# Altium schematic symbol library Блоки трансформаторов импульсных.SCHLIB: 325 symbols (part 2 of 2)
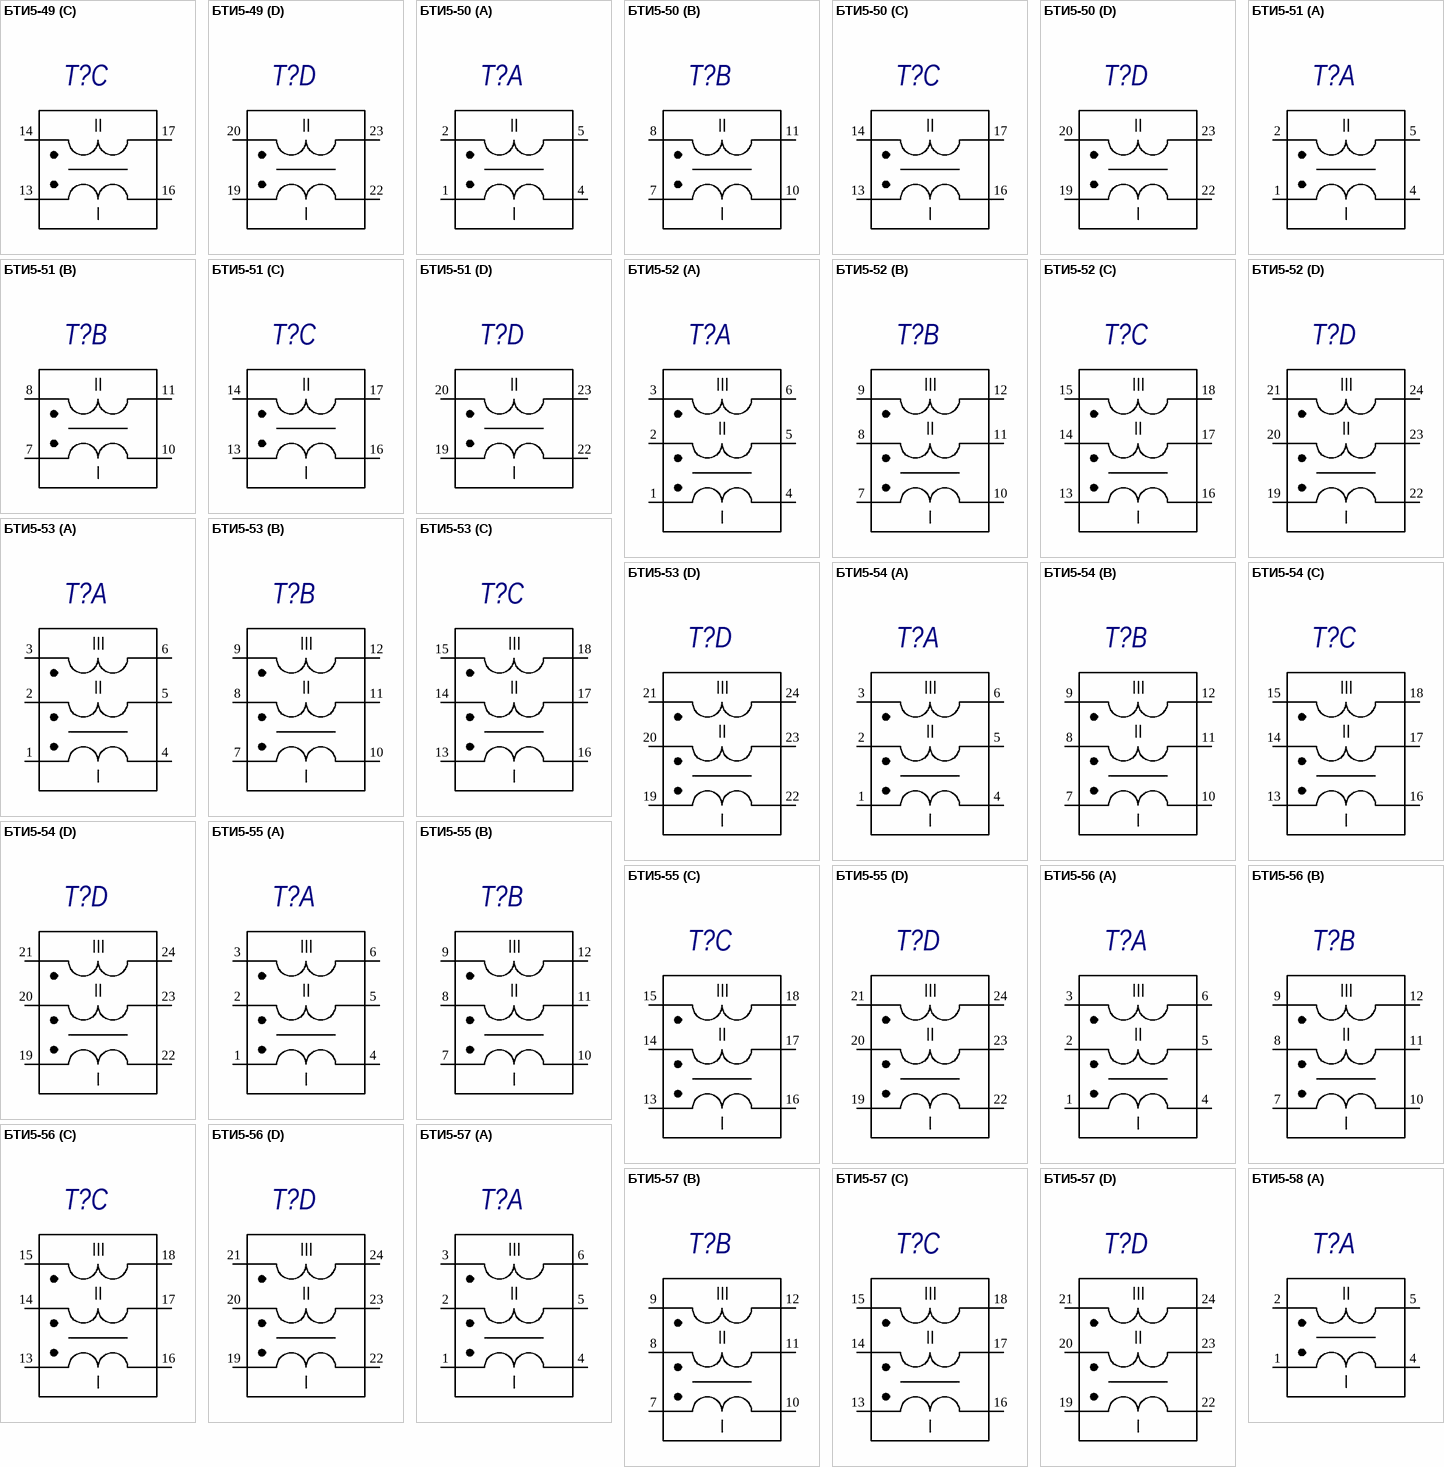
[diagram p28: symbols БТИ5-49 to БТИ5-58]

## БТИ5-57
designator T?
БТИ5; Manufacturer: ПАО  «МСТАТОР»; ManufacturerCountry: Россия; Value: {Value}; Наименование элемента: Дроссель; Category: Трансформатор; ComponentLink1Description: Manufacturer Link
footprint БТИ5
part A pins: 1, 2, 3, 4, 5, 6
part B pins: 7, 8, 9, 10, 11, 12
part C pins: 13, 14, 15, 16, 17, 18
part D pins: 19, 20, 21, 22, 23, 24
part A text: III; II; I
part B text: III; II; I
part C text: III; II; I
part D text: III; II; I

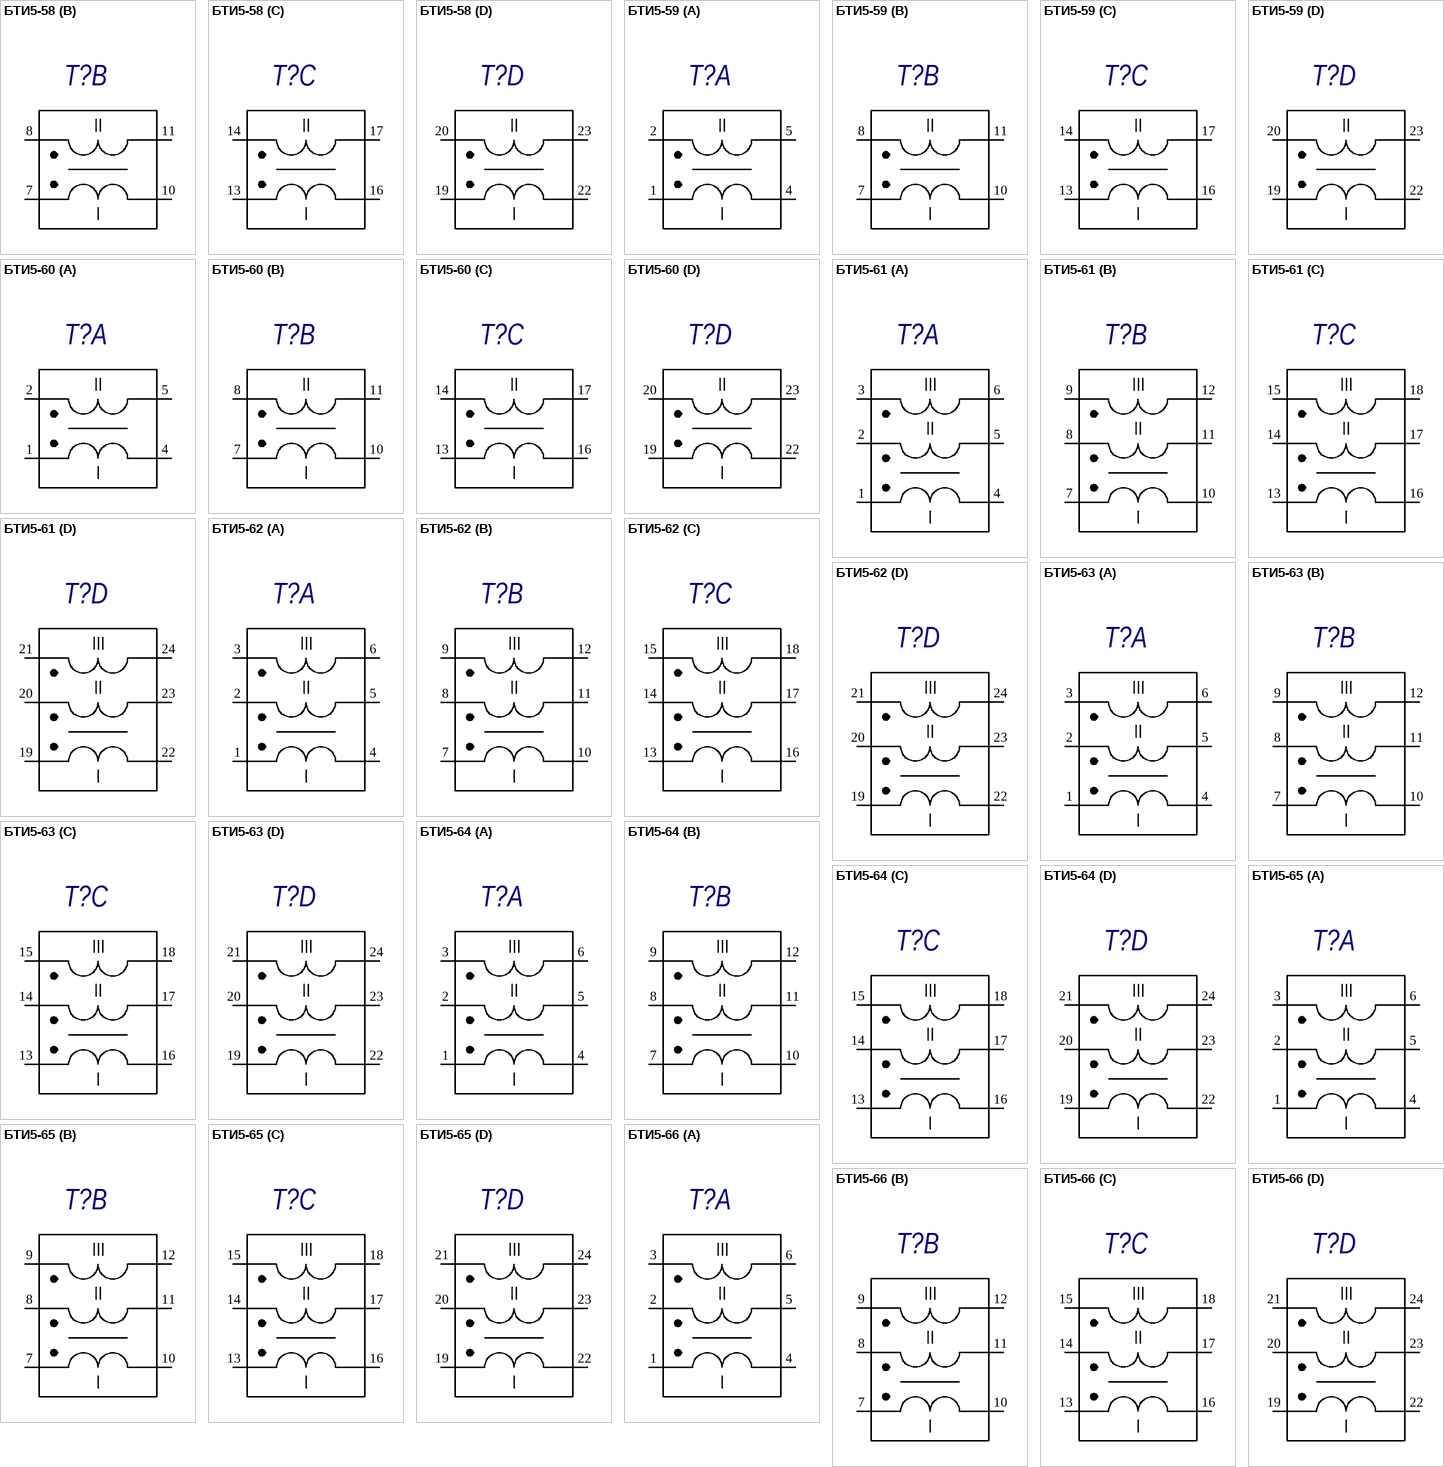
[diagram p18: symbols БТИ5-58 to БТИ5-66]

## БТИ5-58
designator T?
БТИ5; Manufacturer: ПАО  «МСТАТОР»; ManufacturerCountry: Россия; Value: {Value}; Наименование элемента: Дроссель; Category: Трансформатор; ComponentLink1Description: Manufacturer Link
footprint БТИ5
part A pins: 1, 2, 4, 5
part B pins: 7, 8, 10, 11
part C pins: 13, 14, 16, 17
part D pins: 19, 20, 22, 23
part A text: II; I
part B text: II; I
part C text: II; I
part D text: II; I

## БТИ5-59
designator T?
БТИ5; Manufacturer: ПАО  «МСТАТОР»; ManufacturerCountry: Россия; Value: {Value}; Наименование элемента: Дроссель; Category: Трансформатор; ComponentLink1Description: Manufacturer Link
footprint БТИ5
part A pins: 1, 2, 4, 5
part B pins: 7, 8, 10, 11
part C pins: 13, 14, 16, 17
part D pins: 19, 20, 22, 23
part A text: II; I
part B text: II; I
part C text: II; I
part D text: II; I

## БТИ5-60
designator T?
БТИ5; Manufacturer: ПАО  «МСТАТОР»; ManufacturerCountry: Россия; Value: {Value}; Наименование элемента: Дроссель; Category: Трансформатор; ComponentLink1Description: Manufacturer Link
footprint БТИ5
part A pins: 1, 2, 4, 5
part B pins: 7, 8, 10, 11
part C pins: 13, 14, 16, 17
part D pins: 19, 20, 22, 23
part A text: II; I
part B text: II; I
part C text: II; I
part D text: II; I

## БТИ5-61
designator T?
БТИ5; Manufacturer: ПАО  «МСТАТОР»; ManufacturerCountry: Россия; Value: {Value}; Наименование элемента: Дроссель; Category: Трансформатор; ComponentLink1Description: Manufacturer Link
footprint БТИ5
part A pins: 1, 2, 3, 4, 5, 6
part B pins: 7, 8, 9, 10, 11, 12
part C pins: 13, 14, 15, 16, 17, 18
part D pins: 19, 20, 21, 22, 23, 24
part A text: III; II; I
part B text: III; II; I
part C text: III; II; I
part D text: III; II; I

## БТИ5-62
designator T?
БТИ5; Manufacturer: ПАО  «МСТАТОР»; ManufacturerCountry: Россия; Value: {Value}; Наименование элемента: Дроссель; Category: Трансформатор; ComponentLink1Description: Manufacturer Link
footprint БТИ5
part A pins: 1, 2, 3, 4, 5, 6
part B pins: 7, 8, 9, 10, 11, 12
part C pins: 13, 14, 15, 16, 17, 18
part D pins: 19, 20, 21, 22, 23, 24
part A text: III; II; I
part B text: III; II; I
part C text: III; II; I
part D text: III; II; I

## БТИ5-63
designator T?
БТИ5; Manufacturer: ПАО  «МСТАТОР»; ManufacturerCountry: Россия; Value: {Value}; Наименование элемента: Дроссель; Category: Трансформатор; ComponentLink1Description: Manufacturer Link
footprint БТИ5
part A pins: 1, 2, 3, 4, 5, 6
part B pins: 7, 8, 9, 10, 11, 12
part C pins: 13, 14, 15, 16, 17, 18
part D pins: 19, 20, 21, 22, 23, 24
part A text: III; II; I
part B text: III; II; I
part C text: III; II; I
part D text: III; II; I

## БТИ5-64
designator T?
БТИ5; Manufacturer: ПАО  «МСТАТОР»; ManufacturerCountry: Россия; Value: {Value}; Наименование элемента: Дроссель; Category: Трансформатор; ComponentLink1Description: Manufacturer Link
footprint БТИ5
part A pins: 1, 2, 3, 4, 5, 6
part B pins: 7, 8, 9, 10, 11, 12
part C pins: 13, 14, 15, 16, 17, 18
part D pins: 19, 20, 21, 22, 23, 24
part A text: III; II; I
part B text: III; II; I
part C text: III; II; I
part D text: III; II; I

## БТИ5-65
designator T?
БТИ5; Manufacturer: ПАО  «МСТАТОР»; ManufacturerCountry: Россия; Value: {Value}; Наименование элемента: Дроссель; Category: Трансформатор; ComponentLink1Description: Manufacturer Link
footprint БТИ5
part A pins: 1, 2, 3, 4, 5, 6
part B pins: 7, 8, 9, 10, 11, 12
part C pins: 13, 14, 15, 16, 17, 18
part D pins: 19, 20, 21, 22, 23, 24
part A text: III; II; I
part B text: III; II; I
part C text: III; II; I
part D text: III; II; I

## БТИ5-66
designator T?
БТИ5; Manufacturer: ПАО  «МСТАТОР»; ManufacturerCountry: Россия; Value: {Value}; Наименование элемента: Дроссель; Category: Трансформатор; ComponentLink1Description: Manufacturer Link
footprint БТИ5
part A pins: 1, 2, 3, 4, 5, 6
part B pins: 7, 8, 9, 10, 11, 12
part C pins: 13, 14, 15, 16, 17, 18
part D pins: 19, 20, 21, 22, 23, 24
part A text: III; II; I
part B text: III; II; I
part C text: III; II; I
part D text: III; II; I

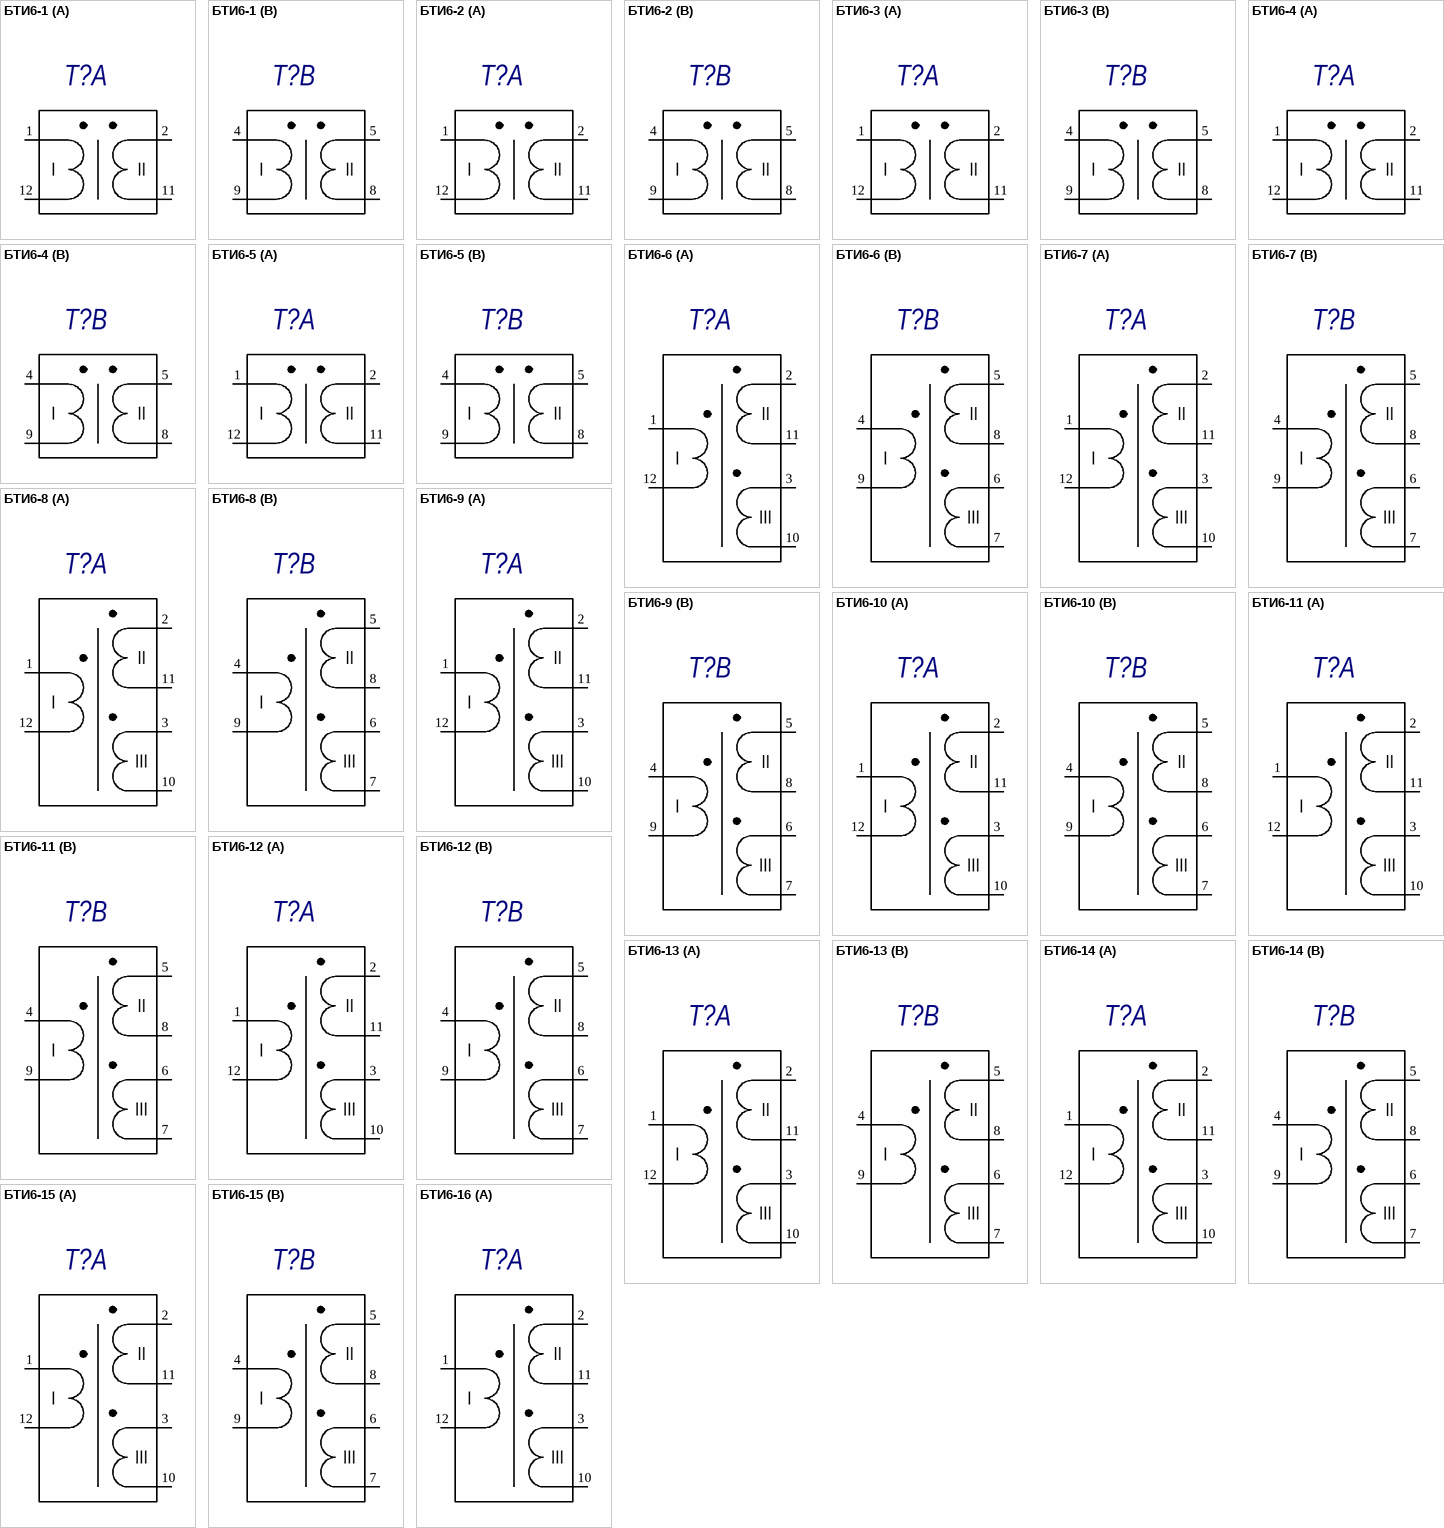
[diagram p19: symbols БТИ6-1 to БТИ6-16]

## БТИ6-1
designator T?
БТИ6; Manufacturer: ПАО  «МСТАТОР»; ManufacturerCountry: Россия; Value: {Value}; Наименование элемента: Дроссель; Category: Трансформатор; ComponentLink1Description: Manufacturer Link
footprint БТИ6
part A pins: 1, 2, 11, 12
part B pins: 4, 5, 8, 9
part A text: I; II
part B text: I; II

## БТИ6-2
designator T?
БТИ6; Manufacturer: ПАО  «МСТАТОР»; ManufacturerCountry: Россия; Value: {Value}; Наименование элемента: Дроссель; Category: Трансформатор; ComponentLink1Description: Manufacturer Link
footprint БТИ6
part A pins: 1, 2, 11, 12
part B pins: 4, 5, 8, 9
part A text: I; II
part B text: I; II

## БТИ6-3
designator T?
БТИ6; Manufacturer: ПАО  «МСТАТОР»; ManufacturerCountry: Россия; Value: {Value}; Наименование элемента: Дроссель; Category: Трансформатор; ComponentLink1Description: Manufacturer Link
footprint БТИ6
part A pins: 1, 2, 11, 12
part B pins: 4, 5, 8, 9
part A text: I; II
part B text: I; II

## БТИ6-4
designator T?
БТИ6; Manufacturer: ПАО  «МСТАТОР»; ManufacturerCountry: Россия; Value: {Value}; Наименование элемента: Дроссель; Category: Трансформатор; ComponentLink1Description: Manufacturer Link
footprint БТИ6
part A pins: 1, 2, 11, 12
part B pins: 4, 5, 8, 9
part A text: I; II
part B text: I; II

## БТИ6-5
designator T?
БТИ6; Manufacturer: ПАО  «МСТАТОР»; ManufacturerCountry: Россия; Value: {Value}; Наименование элемента: Дроссель; Category: Трансформатор; ComponentLink1Description: Manufacturer Link
footprint БТИ6
part A pins: 1, 2, 11, 12
part B pins: 4, 5, 8, 9
part A text: I; II
part B text: I; II

## БТИ6-6
designator T?
БТИ6; Manufacturer: ПАО  «МСТАТОР»; ManufacturerCountry: Россия; Value: {Value}; Наименование элемента: Дроссель; Category: Трансформатор; ComponentLink1Description: Manufacturer Link
footprint БТИ6
part A pins: 1, 2, 3, 10, 11, 12
part B pins: 4, 5, 6, 7, 8, 9
part A text: II; I; III
part B text: II; I; III

## БТИ6-7
designator T?
БТИ6; Manufacturer: ПАО  «МСТАТОР»; ManufacturerCountry: Россия; Value: {Value}; Наименование элемента: Дроссель; Category: Трансформатор; ComponentLink1Description: Manufacturer Link
footprint БТИ6
part A pins: 1, 2, 3, 10, 11, 12
part B pins: 4, 5, 6, 7, 8, 9
part A text: II; I; III
part B text: II; I; III

## БТИ6-8
designator T?
БТИ6; Manufacturer: ПАО  «МСТАТОР»; ManufacturerCountry: Россия; Value: {Value}; Наименование элемента: Дроссель; Category: Трансформатор; ComponentLink1Description: Manufacturer Link
footprint БТИ6
part A pins: 1, 2, 3, 10, 11, 12
part B pins: 4, 5, 6, 7, 8, 9
part A text: II; I; III
part B text: II; I; III

## БТИ6-9
designator T?
БТИ6; Manufacturer: ПАО  «МСТАТОР»; ManufacturerCountry: Россия; Value: {Value}; Наименование элемента: Дроссель; Category: Трансформатор; ComponentLink1Description: Manufacturer Link
footprint БТИ6
part A pins: 1, 2, 3, 10, 11, 12
part B pins: 4, 5, 6, 7, 8, 9
part A text: II; I; III
part B text: II; I; III

## БТИ6-10
designator T?
БТИ6; Manufacturer: ПАО  «МСТАТОР»; ManufacturerCountry: Россия; Value: {Value}; Наименование элемента: Дроссель; Category: Трансформатор; ComponentLink1Description: Manufacturer Link
footprint БТИ6
part A pins: 1, 2, 3, 10, 11, 12
part B pins: 4, 5, 6, 7, 8, 9
part A text: II; I; III
part B text: II; I; III

## БТИ6-11
designator T?
БТИ6; Manufacturer: ПАО  «МСТАТОР»; ManufacturerCountry: Россия; Value: {Value}; Наименование элемента: Дроссель; Category: Трансформатор; ComponentLink1Description: Manufacturer Link
footprint БТИ6
part A pins: 1, 2, 3, 10, 11, 12
part B pins: 4, 5, 6, 7, 8, 9
part A text: II; I; III
part B text: II; I; III

## БТИ6-12
designator T?
БТИ6; Manufacturer: ПАО  «МСТАТОР»; ManufacturerCountry: Россия; Value: {Value}; Наименование элемента: Дроссель; Category: Трансформатор; ComponentLink1Description: Manufacturer Link
footprint БТИ6
part A pins: 1, 2, 3, 10, 11, 12
part B pins: 4, 5, 6, 7, 8, 9
part A text: II; I; III
part B text: II; I; III

## БТИ6-13
designator T?
БТИ6; Manufacturer: ПАО  «МСТАТОР»; ManufacturerCountry: Россия; Value: {Value}; Наименование элемента: Дроссель; Category: Трансформатор; ComponentLink1Description: Manufacturer Link
footprint БТИ6
part A pins: 1, 2, 3, 10, 11, 12
part B pins: 4, 5, 6, 7, 8, 9
part A text: II; I; III
part B text: II; I; III

## БТИ6-14
designator T?
БТИ6; Manufacturer: ПАО  «МСТАТОР»; ManufacturerCountry: Россия; Value: {Value}; Наименование элемента: Дроссель; Category: Трансформатор; ComponentLink1Description: Manufacturer Link
footprint БТИ6
part A pins: 1, 2, 3, 10, 11, 12
part B pins: 4, 5, 6, 7, 8, 9
part A text: II; I; III
part B text: II; I; III

## БТИ6-15
designator T?
БТИ6; Manufacturer: ПАО  «МСТАТОР»; ManufacturerCountry: Россия; Value: {Value}; Наименование элемента: Дроссель; Category: Трансформатор; ComponentLink1Description: Manufacturer Link
footprint БТИ6
part A pins: 1, 2, 3, 10, 11, 12
part B pins: 4, 5, 6, 7, 8, 9
part A text: II; I; III
part B text: II; I; III

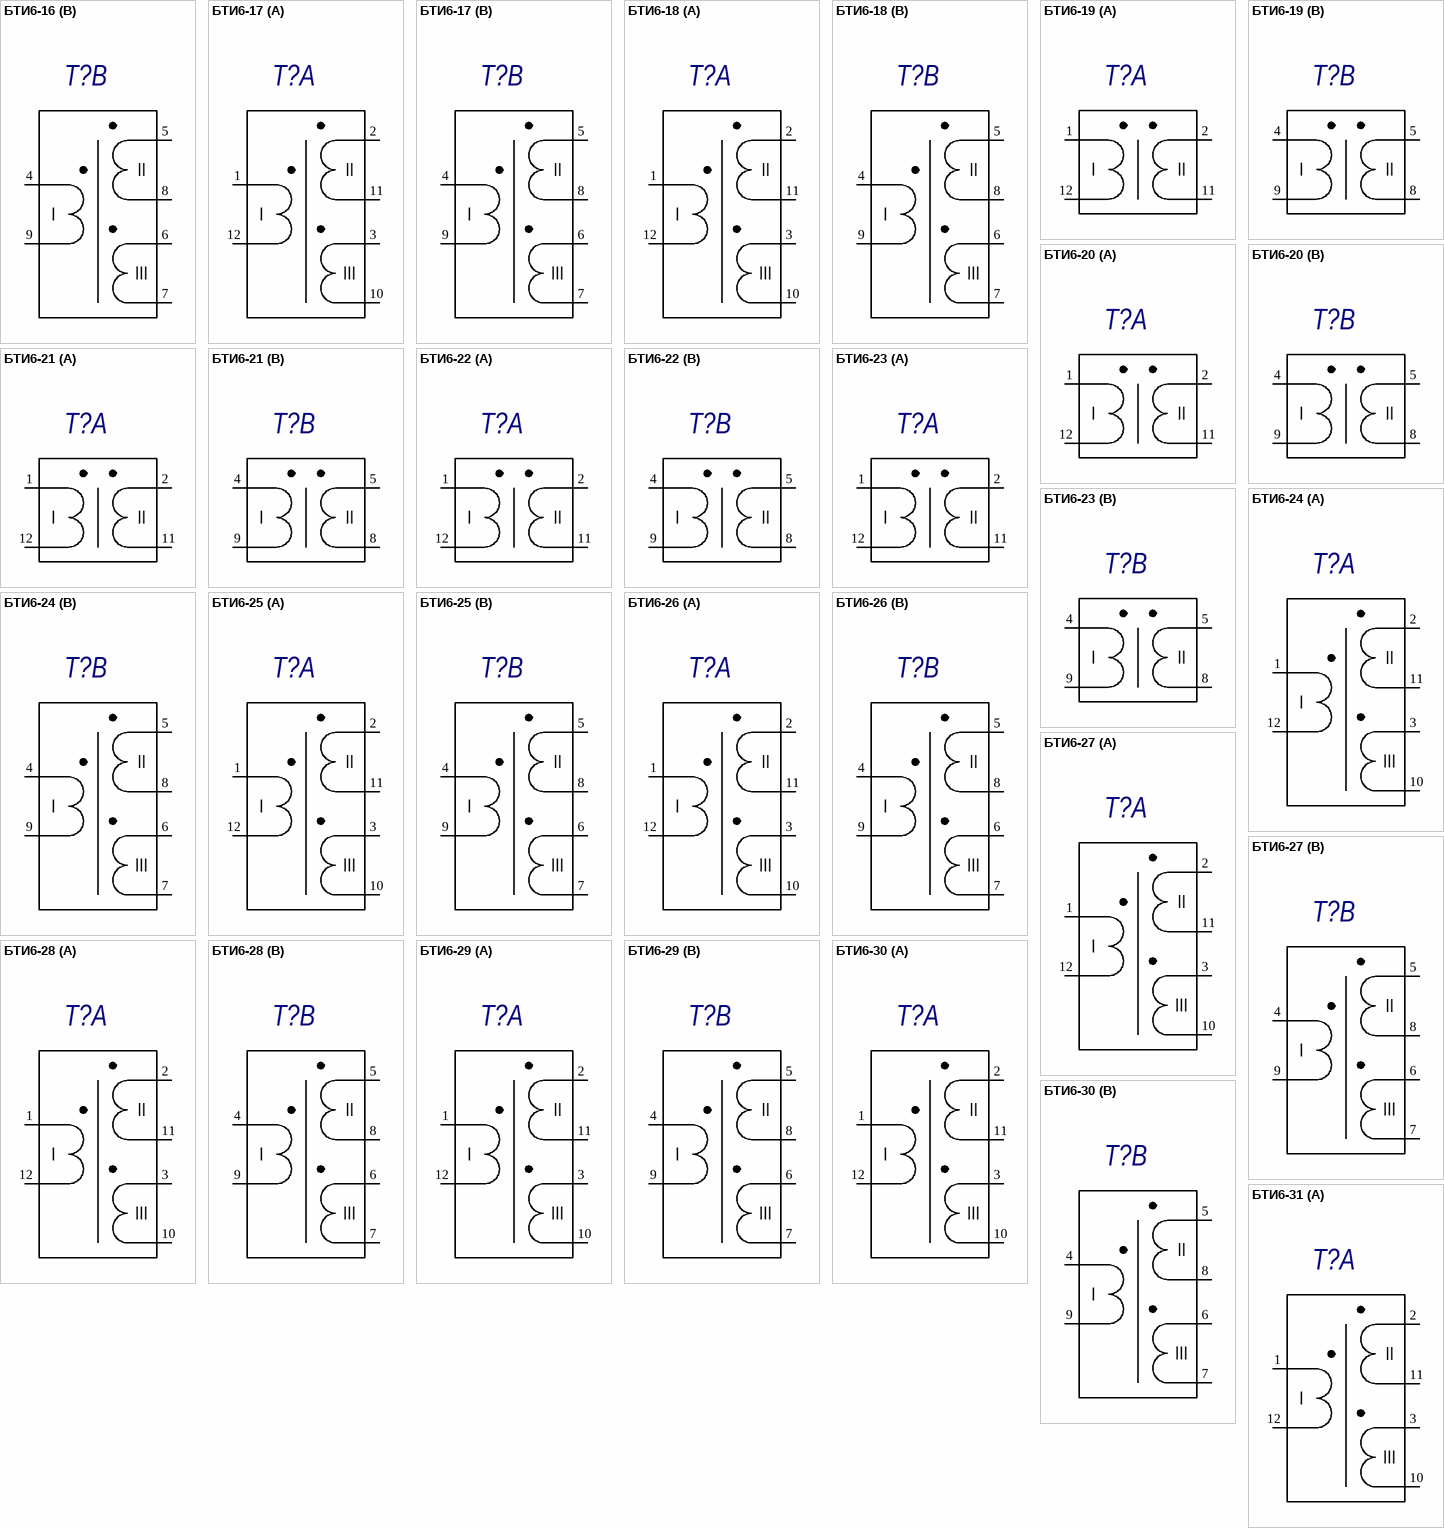
[diagram p20: symbols БТИ6-16 to БТИ6-31]

## БТИ6-16
designator T?
БТИ6; Manufacturer: ПАО  «МСТАТОР»; ManufacturerCountry: Россия; Value: {Value}; Наименование элемента: Дроссель; Category: Трансформатор; ComponentLink1Description: Manufacturer Link
footprint БТИ6
part A pins: 1, 2, 3, 10, 11, 12
part B pins: 4, 5, 6, 7, 8, 9
part A text: II; I; III
part B text: II; I; III

## БТИ6-17
designator T?
БТИ6; Manufacturer: ПАО  «МСТАТОР»; ManufacturerCountry: Россия; Value: {Value}; Наименование элемента: Дроссель; Category: Трансформатор; ComponentLink1Description: Manufacturer Link
footprint БТИ6
part A pins: 1, 2, 3, 10, 11, 12
part B pins: 4, 5, 6, 7, 8, 9
part A text: II; I; III
part B text: II; I; III

## БТИ6-18
designator T?
БТИ6; Manufacturer: ПАО  «МСТАТОР»; ManufacturerCountry: Россия; Value: {Value}; Наименование элемента: Дроссель; Category: Трансформатор; ComponentLink1Description: Manufacturer Link
footprint БТИ6
part A pins: 1, 2, 3, 10, 11, 12
part B pins: 4, 5, 6, 7, 8, 9
part A text: II; I; III
part B text: II; I; III

## БТИ6-19
designator T?
БТИ6; Manufacturer: ПАО  «МСТАТОР»; ManufacturerCountry: Россия; Value: {Value}; Наименование элемента: Дроссель; Category: Трансформатор; ComponentLink1Description: Manufacturer Link
footprint БТИ6
part A pins: 1, 2, 11, 12
part B pins: 4, 5, 8, 9
part A text: I; II
part B text: I; II

## БТИ6-20
designator T?
БТИ6; Manufacturer: ПАО  «МСТАТОР»; ManufacturerCountry: Россия; Value: {Value}; Наименование элемента: Дроссель; Category: Трансформатор; ComponentLink1Description: Manufacturer Link
footprint БТИ6
part A pins: 1, 2, 11, 12
part B pins: 4, 5, 8, 9
part A text: I; II
part B text: I; II

## БТИ6-21
designator T?
БТИ6; Manufacturer: ПАО  «МСТАТОР»; ManufacturerCountry: Россия; Value: {Value}; Наименование элемента: Дроссель; Category: Трансформатор; ComponentLink1Description: Manufacturer Link
footprint БТИ6
part A pins: 1, 2, 11, 12
part B pins: 4, 5, 8, 9
part A text: I; II
part B text: I; II

## БТИ6-22
designator T?
БТИ6; Manufacturer: ПАО  «МСТАТОР»; ManufacturerCountry: Россия; Value: {Value}; Наименование элемента: Дроссель; Category: Трансформатор; ComponentLink1Description: Manufacturer Link
footprint БТИ6
part A pins: 1, 2, 11, 12
part B pins: 4, 5, 8, 9
part A text: I; II
part B text: I; II

## БТИ6-23
designator T?
БТИ6; Manufacturer: ПАО  «МСТАТОР»; ManufacturerCountry: Россия; Value: {Value}; Наименование элемента: Дроссель; Category: Трансформатор; ComponentLink1Description: Manufacturer Link
footprint БТИ6
part A pins: 1, 2, 11, 12
part B pins: 4, 5, 8, 9
part A text: I; II
part B text: I; II

## БТИ6-24
designator T?
БТИ6; Manufacturer: ПАО  «МСТАТОР»; ManufacturerCountry: Россия; Value: {Value}; Наименование элемента: Дроссель; Category: Трансформатор; ComponentLink1Description: Manufacturer Link
footprint БТИ6
part A pins: 1, 2, 3, 10, 11, 12
part B pins: 4, 5, 6, 7, 8, 9
part A text: II; I; III
part B text: II; I; III

## БТИ6-25
designator T?
БТИ6; Manufacturer: ПАО  «МСТАТОР»; ManufacturerCountry: Россия; Value: {Value}; Наименование элемента: Дроссель; Category: Трансформатор; ComponentLink1Description: Manufacturer Link
footprint БТИ6
part A pins: 1, 2, 3, 10, 11, 12
part B pins: 4, 5, 6, 7, 8, 9
part A text: II; I; III
part B text: II; I; III

## БТИ6-26
designator T?
БТИ6; Manufacturer: ПАО  «МСТАТОР»; ManufacturerCountry: Россия; Value: {Value}; Наименование элемента: Дроссель; Category: Трансформатор; ComponentLink1Description: Manufacturer Link
footprint БТИ6
part A pins: 1, 2, 3, 10, 11, 12
part B pins: 4, 5, 6, 7, 8, 9
part A text: II; I; III
part B text: II; I; III

## БТИ6-27
designator T?
БТИ6; Manufacturer: ПАО  «МСТАТОР»; ManufacturerCountry: Россия; Value: {Value}; Наименование элемента: Дроссель; Category: Трансформатор; ComponentLink1Description: Manufacturer Link
footprint БТИ6
part A pins: 1, 2, 3, 10, 11, 12
part B pins: 4, 5, 6, 7, 8, 9
part A text: II; I; III
part B text: II; I; III

## БТИ6-28
designator T?
БТИ6; Manufacturer: ПАО  «МСТАТОР»; ManufacturerCountry: Россия; Value: {Value}; Наименование элемента: Дроссель; Category: Трансформатор; ComponentLink1Description: Manufacturer Link
footprint БТИ6
part A pins: 1, 2, 3, 10, 11, 12
part B pins: 4, 5, 6, 7, 8, 9
part A text: II; I; III
part B text: II; I; III

## БТИ6-29
designator T?
БТИ6; Manufacturer: ПАО  «МСТАТОР»; ManufacturerCountry: Россия; Value: {Value}; Наименование элемента: Дроссель; Category: Трансформатор; ComponentLink1Description: Manufacturer Link
footprint БТИ6
part A pins: 1, 2, 3, 10, 11, 12
part B pins: 4, 5, 6, 7, 8, 9
part A text: II; I; III
part B text: II; I; III

## БТИ6-30
designator T?
БТИ6; Manufacturer: ПАО  «МСТАТОР»; ManufacturerCountry: Россия; Value: {Value}; Наименование элемента: Дроссель; Category: Трансформатор; ComponentLink1Description: Manufacturer Link
footprint БТИ6
part A pins: 1, 2, 3, 10, 11, 12
part B pins: 4, 5, 6, 7, 8, 9
part A text: II; I; III
part B text: II; I; III

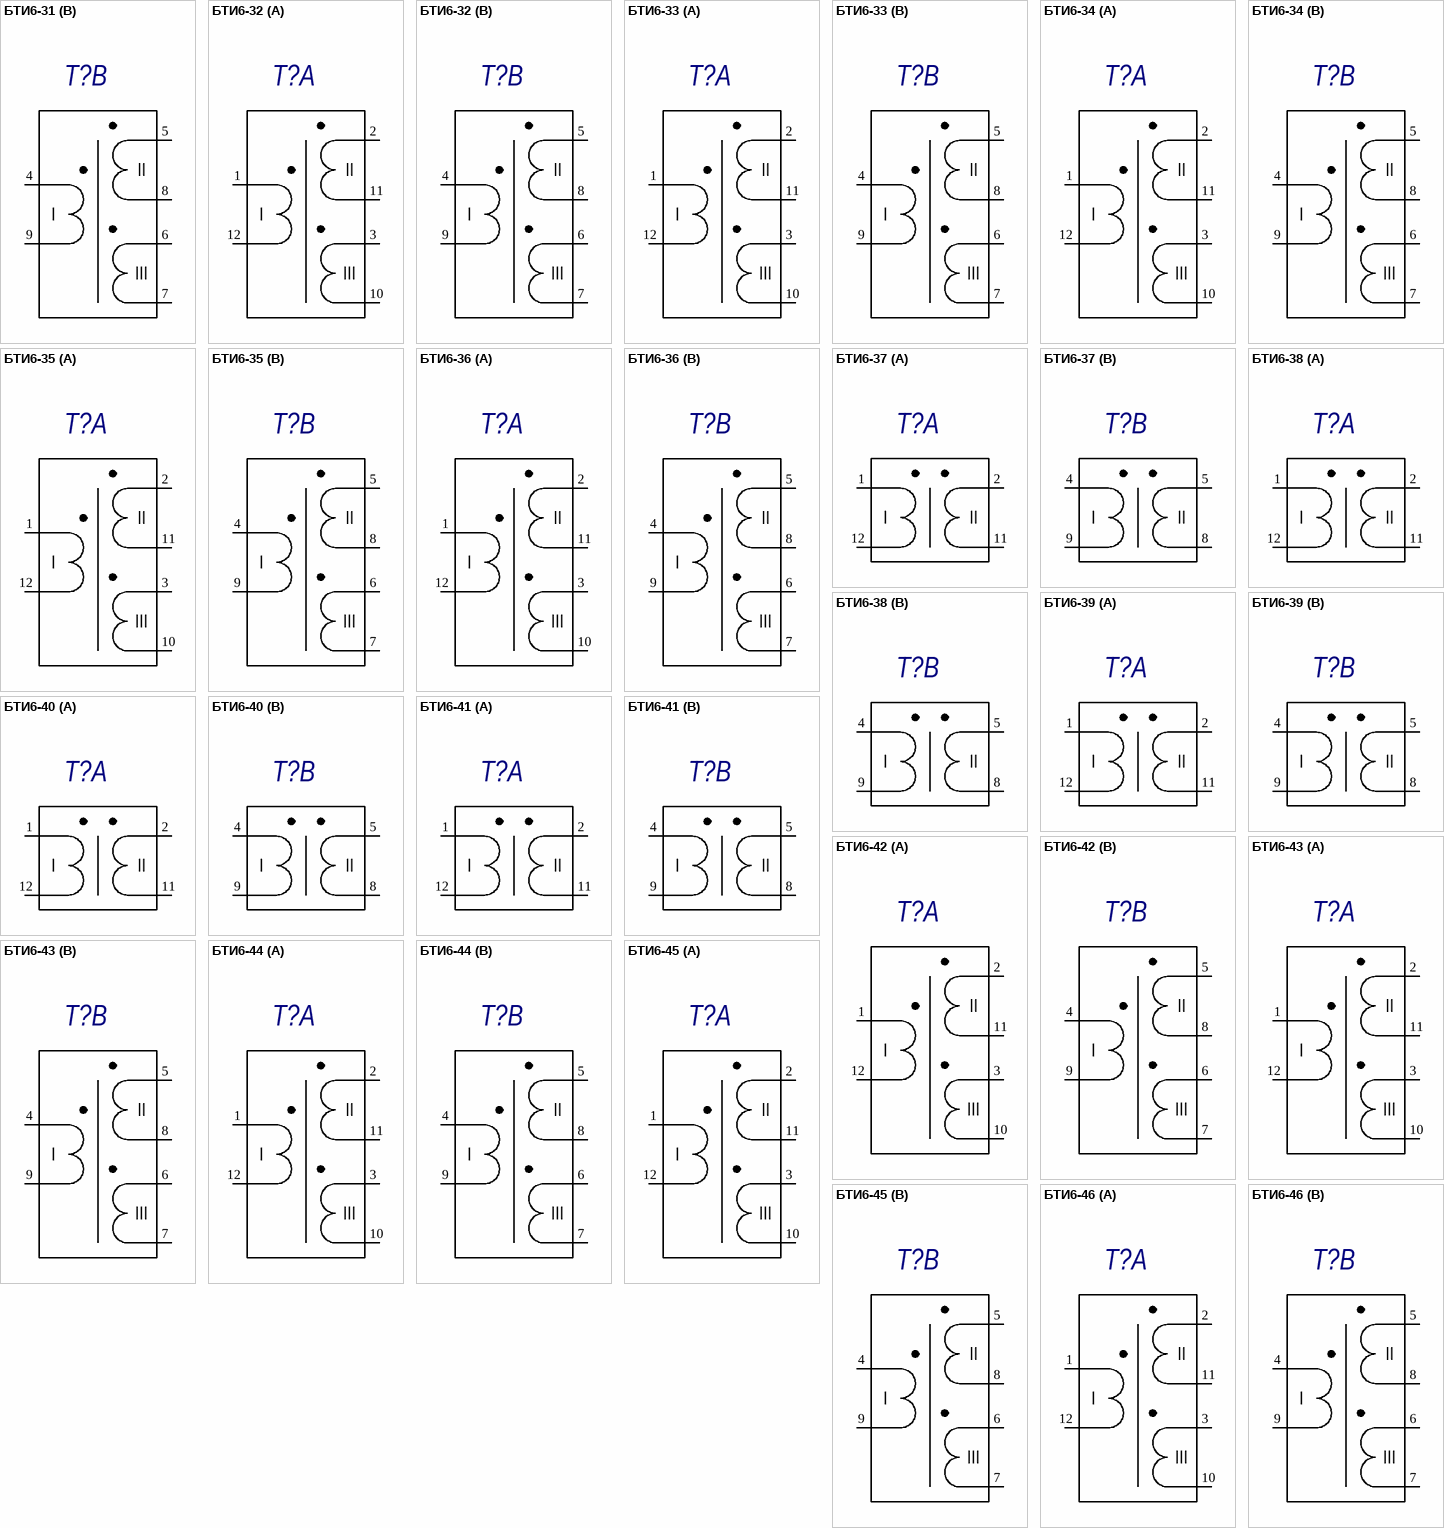
[diagram p21: symbols БТИ6-31 to БТИ6-46]

## БТИ6-31
designator T?
БТИ6; Manufacturer: ПАО  «МСТАТОР»; ManufacturerCountry: Россия; Value: {Value}; Наименование элемента: Дроссель; Category: Трансформатор; ComponentLink1Description: Manufacturer Link
footprint БТИ6
part A pins: 1, 2, 3, 10, 11, 12
part B pins: 4, 5, 6, 7, 8, 9
part A text: II; I; III
part B text: II; I; III

## БТИ6-32
designator T?
БТИ6; Manufacturer: ПАО  «МСТАТОР»; ManufacturerCountry: Россия; Value: {Value}; Наименование элемента: Дроссель; Category: Трансформатор; ComponentLink1Description: Manufacturer Link
footprint БТИ6
part A pins: 1, 2, 3, 10, 11, 12
part B pins: 4, 5, 6, 7, 8, 9
part A text: II; I; III
part B text: II; I; III

## БТИ6-33
designator T?
БТИ6; Manufacturer: ПАО  «МСТАТОР»; ManufacturerCountry: Россия; Value: {Value}; Наименование элемента: Дроссель; Category: Трансформатор; ComponentLink1Description: Manufacturer Link
footprint БТИ6
part A pins: 1, 2, 3, 10, 11, 12
part B pins: 4, 5, 6, 7, 8, 9
part A text: II; I; III
part B text: II; I; III

## БТИ6-34
designator T?
БТИ6; Manufacturer: ПАО  «МСТАТОР»; ManufacturerCountry: Россия; Value: {Value}; Наименование элемента: Дроссель; Category: Трансформатор; ComponentLink1Description: Manufacturer Link
footprint БТИ6
part A pins: 1, 2, 3, 10, 11, 12
part B pins: 4, 5, 6, 7, 8, 9
part A text: II; I; III
part B text: II; I; III

## БТИ6-35
designator T?
БТИ6; Manufacturer: ПАО  «МСТАТОР»; ManufacturerCountry: Россия; Value: {Value}; Наименование элемента: Дроссель; Category: Трансформатор; ComponentLink1Description: Manufacturer Link
footprint БТИ6
part A pins: 1, 2, 3, 10, 11, 12
part B pins: 4, 5, 6, 7, 8, 9
part A text: II; I; III
part B text: II; I; III

## БТИ6-36
designator T?
БТИ6; Manufacturer: ПАО  «МСТАТОР»; ManufacturerCountry: Россия; Value: {Value}; Наименование элемента: Дроссель; Category: Трансформатор; ComponentLink1Description: Manufacturer Link
footprint БТИ6
part A pins: 1, 2, 3, 10, 11, 12
part B pins: 4, 5, 6, 7, 8, 9
part A text: II; I; III
part B text: II; I; III

## БТИ6-37
designator T?
БТИ6; Manufacturer: ПАО  «МСТАТОР»; ManufacturerCountry: Россия; Value: {Value}; Наименование элемента: Дроссель; Category: Трансформатор; ComponentLink1Description: Manufacturer Link
footprint БТИ6
part A pins: 1, 2, 11, 12
part B pins: 4, 5, 8, 9
part A text: I; II
part B text: I; II

## БТИ6-38
designator T?
БТИ6; Manufacturer: ПАО  «МСТАТОР»; ManufacturerCountry: Россия; Value: {Value}; Наименование элемента: Дроссель; Category: Трансформатор; ComponentLink1Description: Manufacturer Link
footprint БТИ6
part A pins: 1, 2, 11, 12
part B pins: 4, 5, 8, 9
part A text: I; II
part B text: I; II

## БТИ6-39
designator T?
БТИ6; Manufacturer: ПАО  «МСТАТОР»; ManufacturerCountry: Россия; Value: {Value}; Наименование элемента: Дроссель; Category: Трансформатор; ComponentLink1Description: Manufacturer Link
footprint БТИ6
part A pins: 1, 2, 11, 12
part B pins: 4, 5, 8, 9
part A text: I; II
part B text: I; II

## БТИ6-40
designator T?
БТИ6; Manufacturer: ПАО  «МСТАТОР»; ManufacturerCountry: Россия; Value: {Value}; Наименование элемента: Дроссель; Category: Трансформатор; ComponentLink1Description: Manufacturer Link
footprint БТИ6
part A pins: 1, 2, 11, 12
part B pins: 4, 5, 8, 9
part A text: I; II
part B text: I; II

## БТИ6-41
designator T?
БТИ6; Manufacturer: ПАО  «МСТАТОР»; ManufacturerCountry: Россия; Value: {Value}; Наименование элемента: Дроссель; Category: Трансформатор; ComponentLink1Description: Manufacturer Link
footprint БТИ6
part A pins: 1, 2, 11, 12
part B pins: 4, 5, 8, 9
part A text: I; II
part B text: I; II

## БТИ6-42
designator T?
БТИ6; Manufacturer: ПАО  «МСТАТОР»; ManufacturerCountry: Россия; Value: {Value}; Наименование элемента: Дроссель; Category: Трансформатор; ComponentLink1Description: Manufacturer Link
footprint БТИ6
part A pins: 1, 2, 3, 10, 11, 12
part B pins: 4, 5, 6, 7, 8, 9
part A text: II; I; III
part B text: II; I; III

## БТИ6-43
designator T?
БТИ6; Manufacturer: ПАО  «МСТАТОР»; ManufacturerCountry: Россия; Value: {Value}; Наименование элемента: Дроссель; Category: Трансформатор; ComponentLink1Description: Manufacturer Link
footprint БТИ6
part A pins: 1, 2, 3, 10, 11, 12
part B pins: 4, 5, 6, 7, 8, 9
part A text: II; I; III
part B text: II; I; III

## БТИ6-44
designator T?
БТИ6; Manufacturer: ПАО  «МСТАТОР»; ManufacturerCountry: Россия; Value: {Value}; Наименование элемента: Дроссель; Category: Трансформатор; ComponentLink1Description: Manufacturer Link
footprint БТИ6
part A pins: 1, 2, 3, 10, 11, 12
part B pins: 4, 5, 6, 7, 8, 9
part A text: II; I; III
part B text: II; I; III

## БТИ6-45
designator T?
БТИ6; Manufacturer: ПАО  «МСТАТОР»; ManufacturerCountry: Россия; Value: {Value}; Наименование элемента: Дроссель; Category: Трансформатор; ComponentLink1Description: Manufacturer Link
footprint БТИ6
part A pins: 1, 2, 3, 10, 11, 12
part B pins: 4, 5, 6, 7, 8, 9
part A text: II; I; III
part B text: II; I; III

## БТИ6-46
designator T?
БТИ6; Manufacturer: ПАО  «МСТАТОР»; ManufacturerCountry: Россия; Value: {Value}; Наименование элемента: Дроссель; Category: Трансформатор; ComponentLink1Description: Manufacturer Link
footprint БТИ6
part A pins: 1, 2, 3, 10, 11, 12
part B pins: 4, 5, 6, 7, 8, 9
